# Altium footprint library pUFM_Digital_Interface_R0.1-PCB.PcbLib: 49 footprints (part 1 of 4)
Each footprint in its own frame and in the unit in brackets; x right, y up, seen from the top. Pads: shape width x height; smd on the part's side, far side on the other; paste and mask are expansions set on the pad; w line width, h text height; cw(c..) or ccw(c..) is an arc to the next point about the centre after c.
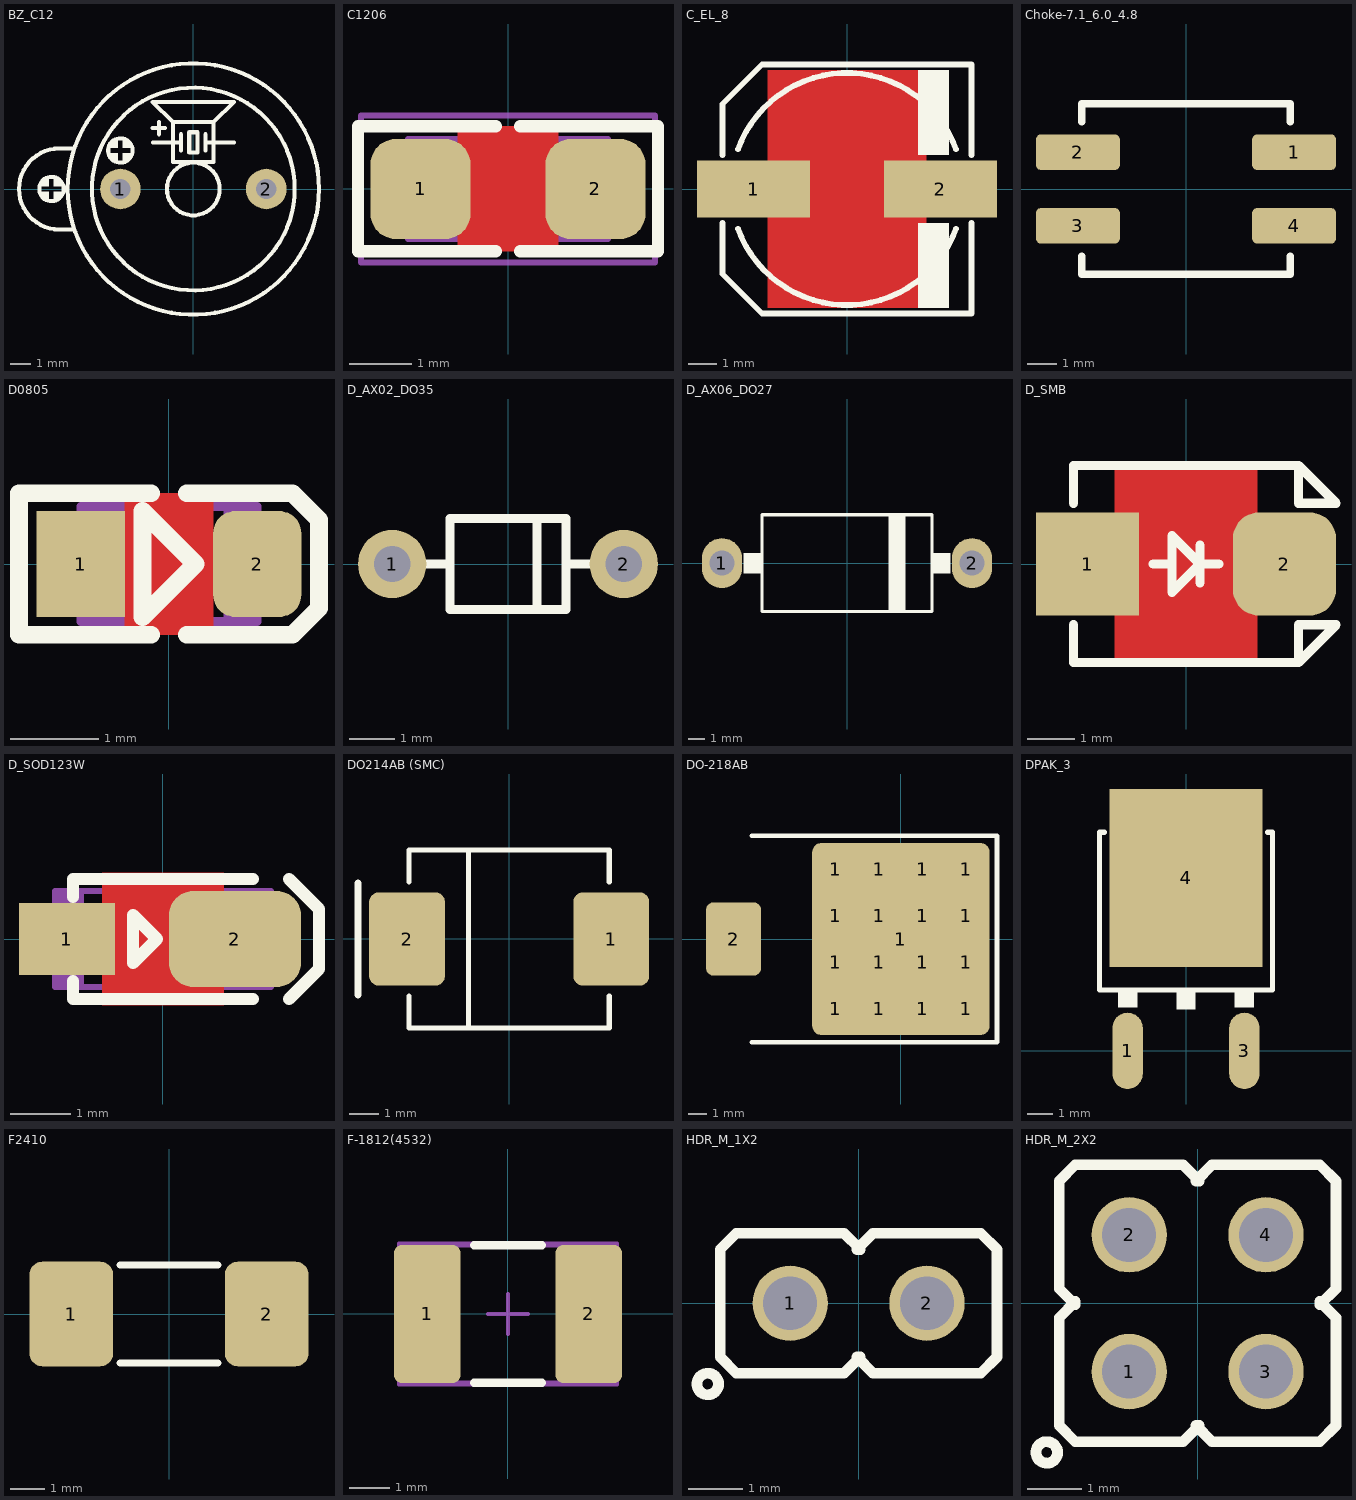
[diagram p0: the footprints below, top view; thin cyan lines are the x and y axes]

## BZ_C12 [mm] "BUZZER 12mm DIA, 8.5mm Height , 7.62mm pitch"
height 6.5
pads (2):
  round 2 hole 1: 1(-3.6,0) 2(3.6,0)
Top Overlay:
  circle w0.2: c-7,0 r0.6
  circle w0.2: c0,0 r6.2
  circle w0.2: c0,0 r5
  circle w0.2: c0,0 r1.3
  circle w0.2: c-3.6,1.9 r0.6
  rectangle: -7.5,0.127 -7.112,0.5
  rectangle: -7.5,-0.5 -7.112,-0.127
  region: -6.5,-0.127 -6.888,-0.127 -6.888,-0.5 -6.5,-0.5
  region: -6.5,0.5 -6.888,0.5 -6.888,0.127 -6.5,0.127
  region: -3.1,2.4 -3.488,2.4 -3.488,2.027 -3.1,2.027
  region: -3.1,1.773 -3.488,1.773 -3.488,1.4 -3.1,1.4
  rectangle: -4.1,1.4 -3.712,1.773
  rectangle: -4.1,2.027 -3.712,2.4
  lines w0.2: -5.9,-2 -6.6,-2 cw(c-6.6,0) -6.6,2 -5.9,2 ; -2.007,3 -1.393,3 ; -2,2.286 -0.6,2.286 ; -1.7,2.7 -1.7,3.314 ; -0.6,1.9 -0.6,2.7 ; 0.6,1.9 0.6,2.7 ; 0.6,2.286 2,2.286 ; -1,3.3 -2.002,4.3 2.002,4.3 1,3.3 ; -1,3.3 -1,1.329 1,1.329 1,3.3 ; -1,3.3 1,3.3 ; -0.2,1.8 0.2,1.8 0.2,2.8 -0.2,2.8 -0.2,1.8
3D body "User Library-Buzzer CEM-1205C.step": height 9.5, standoff -3.5, extent -6,-5.997 6,5.997

## C1206 [mm] "CHIP Capacitor, 3.2X1.6mm, 1206"
height 2
pads (2):
  rrect50% 1.6x1.6 smd paste-0.1 mask+0.075: 1(-1.4,0) 2(1.4,0)
Top Layer:
  pour cut-out: -0.8,1 -0.8,-1 0.8,-1 0.8,1
Top Overlay:
  lines w0.2: -0.2,-1 -2.4,-1 -2.4,1 -0.2,1 ; 0.2,-1 2.4,-1 2.4,1 0.2,1
Mechanical 13:
  lines w0.1: -1.6,-0.8 1.6,-0.8 1.6,0.8 -1.6,0.8 -1.6,-0.8
Mechanical 15:
  lines w0.1: -0.5,0 0.5,0 ; 0,-0.5 0,0.5 ; -2.35,-1.175 2.35,-1.175 2.35,1.175 -2.35,1.175 -2.35,-1.175
3D body "User Library-CAPC3216X10.step": height 1, standoff 0, extent -1.6,-0.8 1.6,0.8

## C_EL_8 [mm] "Electrolytic Cap, Size E, Size F, 8.3X10"
height 10
pads (2):
  rect 4x2 smd: 1(-3.3,0) 2(3.3,0)
Top Layer:
  pour cut-out: 2.794,4.191 2.794,-4.191 -2.794,-4.191 -2.794,4.191
Top Overlay:
  rectangle: 2.5,1.2 3.6,4.2
  rectangle: 2.5,-4.2 3.6,-1.2
  lines w0.2: -4.4,-1.2 -4.4,-3 -3,-4.4 4.4,-4.4 4.4,-1.2 ; -4.4,1.2 -4.4,3 -3,4.4 4.4,4.4 4.4,1.2 ; -3.853,-1.402 ccw(c0,0) 3.853,-1.402 ; -3.853,1.402 cw(c0,0) 3.853,1.402
3D body "Cap_0810.STEP": height 10.3, standoff -0.2, extent -4.902,-4.25 4.798,4.25

## Choke-7.1_6.0_4.8 [mm]
height 6.5
pads (4):
  rrect25% 2.85x1.2 smd: 1(3.675,1.25) 2(-3.675,1.25) 3(-3.675,-1.25) 4(3.675,-1.25)
Top Overlay:
  lines w0.254: -3.55,-2.286 -3.55,-2.9 3.55,-2.9 3.55,-2.286 ; -3.55,2.286 -3.55,2.9 3.55,2.9 3.55,2.286
3D body "Choke-7.1_6.0_4.8.stp": height 4.84, standoff 0.04, extent -4.75,-3 4.649,3
3D body: height 0.04, standoff 0, extent -5.1,0.65 -2.25,1.85
3D body: height 0.04, standoff 0, extent -5.1,-1.85 -2.25,-0.65
3D body: height 0.04, standoff 0, extent 2.25,-1.85 5.1,-0.65
3D body: height 0.04, standoff 0, extent 2.25,0.65 5.1,1.85

## D0805 [mm] "DIODE0805, SOD323 (PHILIPS), SC-76 (JEITA), DL-35, MicroMELF"
height 1.4
pads (2):
  rect 1x1.2 smd paste-2 mask+0.075: 1(-1,0)
  rrect50% 1x1.2 smd paste-2 mask+0.075: 2(1,0)
Top Layer:
  pour cut-out: -0.5,0.8 0.5,0.8 0.5,-0.8 -0.5,-0.8
Top Overlay:
  lines w0.2: -0.2,-0.8 -1.7,-0.8 -1.7,0.8 -0.2,0.8 ; 0.2,-0.8 1.4,-0.8 1.7,-0.5 1.7,0.5 1.4,0.8 0.2,0.8 ; -0.3,-0.6 0.3,0 -0.3,0.6 -0.3,-0.6
Top Paste:
  region: 0.9,0.5 0.82,0.5 0.673,0.439 0.561,0.327 0.5,0.18 0.5,0.1 0.5,-0.1 0.5,-0.18 0.561,-0.327 0.673,-0.439 0.82,-0.5 0.9,-0.5 1.15,-0.5 1.18,-0.5 1.235,-0.477 1.277,-0.435 1.3,-0.38 1.3,-0.35 1.3,0.35 1.3,0.38 1.277,0.435 1.235,0.477 1.18,0.5 1.15,0.5
  region: -0.9,0.5 -0.82,0.5 -0.673,0.439 -0.561,0.327 -0.5,0.18 -0.5,0.1 -0.5,-0.1 -0.5,-0.18 -0.561,-0.327 -0.673,-0.439 -0.82,-0.5 -0.9,-0.5 -1.15,-0.5 -1.18,-0.5 -1.235,-0.477 -1.277,-0.435 -1.3,-0.38 -1.3,-0.35 -1.3,0.35 -1.3,0.38 -1.277,0.435 -1.235,0.477 -1.18,0.5 -1.15,0.5
Mechanical 13:
  region: 0.995,-0.19 0.842,-0.19 0.842,-0.65 0.995,-0.65
  region: 0.995,0.65 0.842,0.65 0.842,0.191 0.995,0.191
  region: 0.848,0.65 0.619,0.65 0.619,-0.65 0.848,-0.65
  rectangle: -0.995,-0.65 -0.842,-0.191
  rectangle: -0.995,0.19 -0.842,0.65
  rectangle: -0.848,-0.65 -0.619,0.65
  lines w0.102: -0.305,0.356 -0.076,0.025 -0.33,0 -0.076,-0.33 ; 0.102,0.356 0.33,0.025 0.076,0 0.33,-0.33 ; -0.076,-0.33 -0.229,-0.279 -0.076,-0.178 -0.076,-0.33 ; 0.33,-0.33 0.178,-0.279 0.33,-0.178 0.33,-0.33 ; -1,-0.65 -1,-0.191 ccw(c-1,0) -1,0.191 -1,0.65 1,0.65 1,0.191 ccw(c1,0) 1,-0.191 1,-0.65 -1,-0.65
3D body "SOD-323.STEP": height 1.17, standoff 0.03, extent -1.43,-0.8 1.43,0.7

## D_AX02_DO35 [mm] "DIODE 0.2 INCH SPACING DO-35, 1N4148"
height 1.8
pads (2):
  round 1.5 hole 0.8: 1(-2.54,0) 2(2.54,0)
Top Overlay:
  lines w0.2: -1.905,0 -1.27,0 ; 0.635,-1 0.635,1 ; 1.27,0 1.93,0 ; -1.27,-1 1.27,-1 1.27,1 -1.27,1 -1.27,-1
3D body "User Library-DO-35G-20.step": height 1.82, standoff -2, extent -2.815,-0.898 2.815,0.898

## D_AX06_DO27 [mm] "DIODE 0.6 INCH SPACING A-500 (Vishay)  DO-201A DO-27 BYW98"
height 6.5
pads (2):
  oval 2.4x3 hole 1.5: 1(-7.5,0) 2(7.5,0)
Top Overlay:
  rectangle: 2.5,-3 3.5,2.9
  region: -6.2,0.6 -5.1,0.6 -5.1,-0.6 -6.2,-0.6
  region: 6.2,0.6 5.1,0.6 5.1,-0.6 6.2,-0.6
  lines w0.2: -5.1,-2.9 -5.1,2.9 5.1,2.9 5.1,-2.9 -5.1,-2.9
3D body "User Library-DO-201AD.STEP": height 7.6, standoff -4, extent -8.28,-2.8 8.28,2.8

## D_SMB [mm] "SMB Molded Diode, 2-Leads, Body 4.3x3.5mm"
height 6.5
pads (2):
  rect 2.2x2.2 smd paste-0.1: 1(-2.1,0)
  rrect50% 2.2x2.2 smd paste-0.1: 2(2.1,0)
Top Layer:
  pour cut-out: -1.524,2.1 -1.524,-2.1 1.524,-2.1 1.524,2.1
Top Overlay:
  lines w0.2: -2.4,-1.3 -2.4,-2.1 2.4,-2.1 ; -2.4,1.3 -2.4,2.1 2.4,2.1 ; -0.7,0 -0.3,0 ; 0.3,-0.4 0.3,0.4 ; 0.7,0 0.3,0 ; 0.3,0 -0.3,-0.6 -0.3,0.6 0.3,0 ; 2.4,-2.1 3.2,-1.3 2.4,-1.3 2.4,-2.1 ; 2.4,2.1 2.4,1.3 3.2,1.3 2.4,2.1
3D body "User Library-DIOM5539X24.step": height 2.45, standoff 0.03, extent -2.75,-1.95 2.75,1.95

## D_SOD123W [mm] "PowerDI-123, SOD123, DO-213AA, 1206D"
height 6.5
pads (2):
  rect 1.6x1.2 smd paste-0.1 mask+0.1: 1(-1.6,0)
  rrect50% 2.2x1.6 smd paste-0.1 mask+0.1: 2(1.2,0)
Top Layer:
  pour cut-out: -1.016,1.1 -1.016,-1.1 1.016,-1.1 1.016,1.1
Top Overlay:
  lines w0.2: -1.5,-0.7 -1.5,-1 1.5,-1 ; -1.5,0.7 -1.5,1 1.5,1 ; 2.1,-1 2.6,-0.5 2.6,0.5 2.1,1 ; -0.5,-0.4 -0.1,0 -0.5,0.4 -0.5,-0.4
Mechanical 13:
  region: -1.316,0.8 -1.8,0.8 -1.8,-0.8 -1.316,-0.8
  lines w0.1: -1.8,-0.8 -1.8,0.8 1.8,0.8 1.8,-0.8 -1.8,-0.8
3D body "User Library-POWERDI-123.STEP": height 1, standoff 0, extent -1.95,-0.965 1.95,0.965

## DO214AB (SMC) [mm]
height 2.54
pads (2):
  rrect25% 2.6x3.2 smd: 1(3.5,0) 2(-3.5,0)
Top Overlay:
  lines w0.178: -3.429,-1.956 -3.429,-3.048 3.429,-3.048 3.429,-1.956 ; -3.429,1.955 -3.429,3.048 3.429,3.048 3.429,1.955 ; -1.397,-3.048 -1.397,3.048
  lines w0.254: -5.182,-1.905 -5.182,1.905
3D body "DO-214AB(SMC).stp": height 2.67, standoff 0.03, extent -4.064,-3.15 4.064,3.149
3D body: height 0.04, standoff 0, extent 2.2,-1.6 4.8,1.6
3D body: height 0.04, standoff 0, extent -4.8,-1.6 -2.2,1.6

## DO-218AB [mil]
height 104.33
pads (18):
  rrect50% 60x60 smd: 1(-140,-150) 1(-140,-50) 1(-140,50) 1(-140,150) 1(-46.67,-150) 1(-46.67,-50) 1(-46.67,50) 1(-46.67,150) 1(46.67,-150) 1(46.67,-50) 1(46.67,50) 1(46.67,150) 1(140,-150) 1(140,-50) 1(140,50) 1(140,150)
  rrect10% 381.89x413.39 smd paste-206.69: 1(0,0)
  rrect25% 118.11x157.48 smd: 2(-360.24,0)
Top Overlay:
  lines w10: -320.87,-222.44 206.69,-222.44 206.69,222.44 -320.87,222.44
3D body "DO-218AB.stp": height 198.23, standoff 1.38, extent -393.7,-196.85 213.76,196.85
3D body: height 1.38, standoff 0, extent -419.29,-78.74 -301.18,78.74
3D body: height 1.38, standoff 0, extent -190.94,-206.69 190.95,206.69

## DPAK_3 [mm] "D-PAK (TO-252), 3-Pads, Body 6.2x6.7mm"
height 2.4
pads (3):
  oval 1.2x3 smd: 1(-2.3,0) 3(2.3,0)
  rect 6x7 smd paste-5: 4(0,6.8)
Top Overlay:
  rectangle: -0.381,1.632 0.381,2.394
  rectangle: -2.667,1.7 -1.905,2.394
  rectangle: 1.905,1.7 2.667,2.394
  lines w0.2: -3.2,8.6 -3.4,8.6 -3.4,2.4 3.4,2.4 3.4,8.6 3.2,8.6
Top Paste:
  region: -0.2,5.9 -1.2,5.9 -1.2,4.9 -0.2,4.9
  region: -0.2,6.3 -0.2,7.3 -1.2,7.3 -1.2,6.3
  rectangle: -2.6,4.9 -1.6,5.9
  rectangle: -1.2,3.5 -0.2,4.5
  region: -1.6,3.5 -1.6,4.5 -2.6,4.5 -2.6,3.5
  region: -2.6,7.3 -2.6,6.3 -1.6,6.3 -1.6,7.3
  region: -1.6,7.7 -1.6,8.7 -2.6,8.7 -2.6,7.7
  rectangle: -1.2,7.7 -0.2,8.7
  rectangle: -2.6,9.1 -1.6,10.1
  region: -0.2,10.1 -1.2,10.1 -1.2,9.1 -0.2,9.1
  rectangle: 0.2,9.1 1.2,10.1
  region: 2.6,10.1 1.6,10.1 1.6,9.1 2.6,9.1
  region: 1.2,8.7 0.2,8.7 0.2,7.7 1.2,7.7
  region: 2.6,7.7 2.6,8.7 1.6,8.7 1.6,7.7
  region: 1.6,7.3 1.6,6.3 2.6,6.3 2.6,7.3
  region: 2.6,3.5 2.6,4.5 1.6,4.5 1.6,3.5
  region: 1.2,4.5 0.2,4.5 0.2,3.5 1.2,3.5
  region: 2.6,5.9 1.6,5.9 1.6,4.9 2.6,4.9
  region: 1.2,6.3 1.2,7.3 0.2,7.3 0.2,6.3
  rectangle: 0.2,4.9 1.2,5.9
3D body "User Library-DPAK_TO-252AA.step": height 2.37, standoff -0.03, extent -3.367,-0.498 3.367,9.602

## F2410 [mm] "FUSE, 6x2.5mm"
height 2.2
pads (2):
  rrect30% 2.4x3 smd paste-0.2 mask+0.1: 1(-2.8,0) 2(2.8,0)
Top Overlay:
  lines w0.2: -1.4,-1.4 1.4,-1.4 ; -1.4,1.4 1.4,1.4
3D body "User Library-2410 fuse.step": height 2.18, standoff 0.02, extent -3.09,-1.25 3.09,1.25

## F-1812(4532) [mil] "Chip Capacitor, Body 4.5x3.2mm, IPC High Density"
height 55.12
pads (2):
  rrect25% 65x135 smd: 1(-78.74,0) 2(78.74,0)
Top Overlay:
  lines w7.87: -33,-67 33,-67 ; -33,67 33,67
Mechanical 13:
  lines w3.94: -94.49,-66.93 94.49,-66.93 94.49,66.93 -94.49,66.93 -94.49,-66.93
Mechanical 15:
  lines w3.94: -19.68,0 19.69,0 ; 0,-19.69 0,19.68 ; -106.3,-68.9 106.3,-68.9 106.3,68.9 -106.3,68.9 -106.3,-68.9
3D body: height 1.38, standoff 0, extent 46.24,-67.5 111.24,67.5
3D body: height 1.38, standoff 0, extent -111.24,-67.5 -46.24,67.5
3D body "1812-F.stp": height 21.46, standoff 1.38, extent -88.58,-62.99 88.59,62.99

## HDR_M_1X2 [mm] "Connector; Header; 2 Position"
height 6.5
pads (2):
  round 1.4 / inner round 1.4 / far side oval 1.4x2.2 hole 1 mask+0.1: 1(-1.27,0) 2(1.27,0)
Top Overlay:
  circle w0.2: c-2.8,-1.5 r0.2
  lines w0.2: -0.03,-1 0.27,-1.3 2.27,-1.3 2.57,-1 2.57,1 2.27,1.3 0.27,1.3 -0.03,1 ; 0.03,-1 -0.27,-1.3 -2.27,-1.3 -2.57,-1 -2.57,1 -2.27,1.3 -0.27,1.3 0.03,1
3D body "pin_header_aw140-eg-g02a.stp": height 8.72, standoff -3.68, extent -2.54,-1.25 2.44,1.25

## HDR_M_2X2 [mm] "Connector; Header; 2x2 Position"
height 6.5
pads (4):
  round 1.4 / inner round 1.4 / far side oval 1.4x2.2 hole 1: 1(-1.27,-1.27)
  round 1.4 / inner round 1.4 / far side oval 1.4x2.2 hole 1 mask+0.1: 2(-1.27,1.27) 3(1.27,-1.27) 4(1.27,1.27)
Top Overlay:
  circle w0.2: c-2.8,-2.77 r0.2
  lines w0.2: -2.27,-0.03 -2.57,0.27 -2.57,2.27 -2.27,2.57 -0.27,2.57 0.03,2.27 ; -2.27,0.03 -2.57,-0.27 -2.57,-2.27 -2.27,-2.57 -0.27,-2.57 0.03,-2.27 ; -0.03,-2.27 0.27,-2.57 2.27,-2.57 2.57,-2.27 2.57,-0.27 2.27,0.03 ; -0.03,2.27 0.27,2.57 2.27,2.57 2.57,2.27 2.57,0.27 2.27,-0.03
3D body "User Library-Header_Male_2Pin.STEP": height 8.54, standoff -3, extent -2.56,-2.54 -0.07,2.54
3D body "User Library-Header_Male_2Pin.STEP": height 8.54, standoff -3, extent -0.02,-2.54 2.47,2.54